# Altium schematic symbol library Sang_library.SchLib: 1607 symbols (part 13 of 15) (continued)
## STM32F303VET6 (continued)
part B pins: 6 VBAT (power) "Backup power supply", 20 VSSA/VREF- (power) "Analog ground/Negative reference voltage", 21 VREF+ (power) "Positive reference voltage", 22 VDDA (power) "Analog power supply", 28 VDD_4 (power) "Digital power supply", 49 VSS_2 (power) "Digital ground", 50 VDD_2 (power) "Digital power supply", 74 VSS_3 (power) "Ground", 75 VDD_3 (power) "Digital power supply", 99 VSS_1 (power) "Ground", 100 VDD_1 (power) "Digital power supply"

## STM32F405RGT7
designator U?
ARM® Cortex®-M4 STM32F4 Microcontroller IC 32-Bit Single-Core 168MHz 1MB (1M x 8) FLASH 64-LQFP (10x10)
footprint LQFP64 (STM) (LQFP64-P-1010-0.50E / 64Pins)
part A pins: 1 VBAT, 12 VSSA, 13 VDDA, 18 VSS, 19 VDD, 32 VDD, 48 VDD, 63 VSS, 64 VDD
part B pins: 2 PC13, 3 PC14-OSC32 IN, 4 PC15-OSC32 OUT, 5 PH0-OSC_IN, 6 PH1-OSC_OUT, 7 ~{RST}, 8 PC0, 9 PC1, 10 PC2, 11 PC3, 14 PA0, 15 PA1, 16 PA2, 17 PA3, 20 PA4, 21 PA5, 22 PA6, 23 PA7, 24 PC4, 25 PC5, 26 PB0, 27 PB1, 28 PB2, 29 PB10, 30 PB11, 31 VCAP_1, 33 PB12, 34 PB13, 35 PB14, 36 PB15, 37 PC6, 38 PC7, 39 PC8, 40 PC9, 41 PA8, 42 PA9, 43 PA10, 44 PA11, 45 PA12, 46 PA13 (JTMS-SWDIO), 47 VCAP_2, 49 PA14 (JTCK-SWCLK), 50 PA15 (JTDI), 51 PC10, 52 PC11, 53 PC12, 54 PD2, 55 PB3 (JTDO/TRACESWO), 56 PB4, 57 PB5, 58 PB6, 59 PB7, 60 BOOT0, 61 PB8, 62 PB9

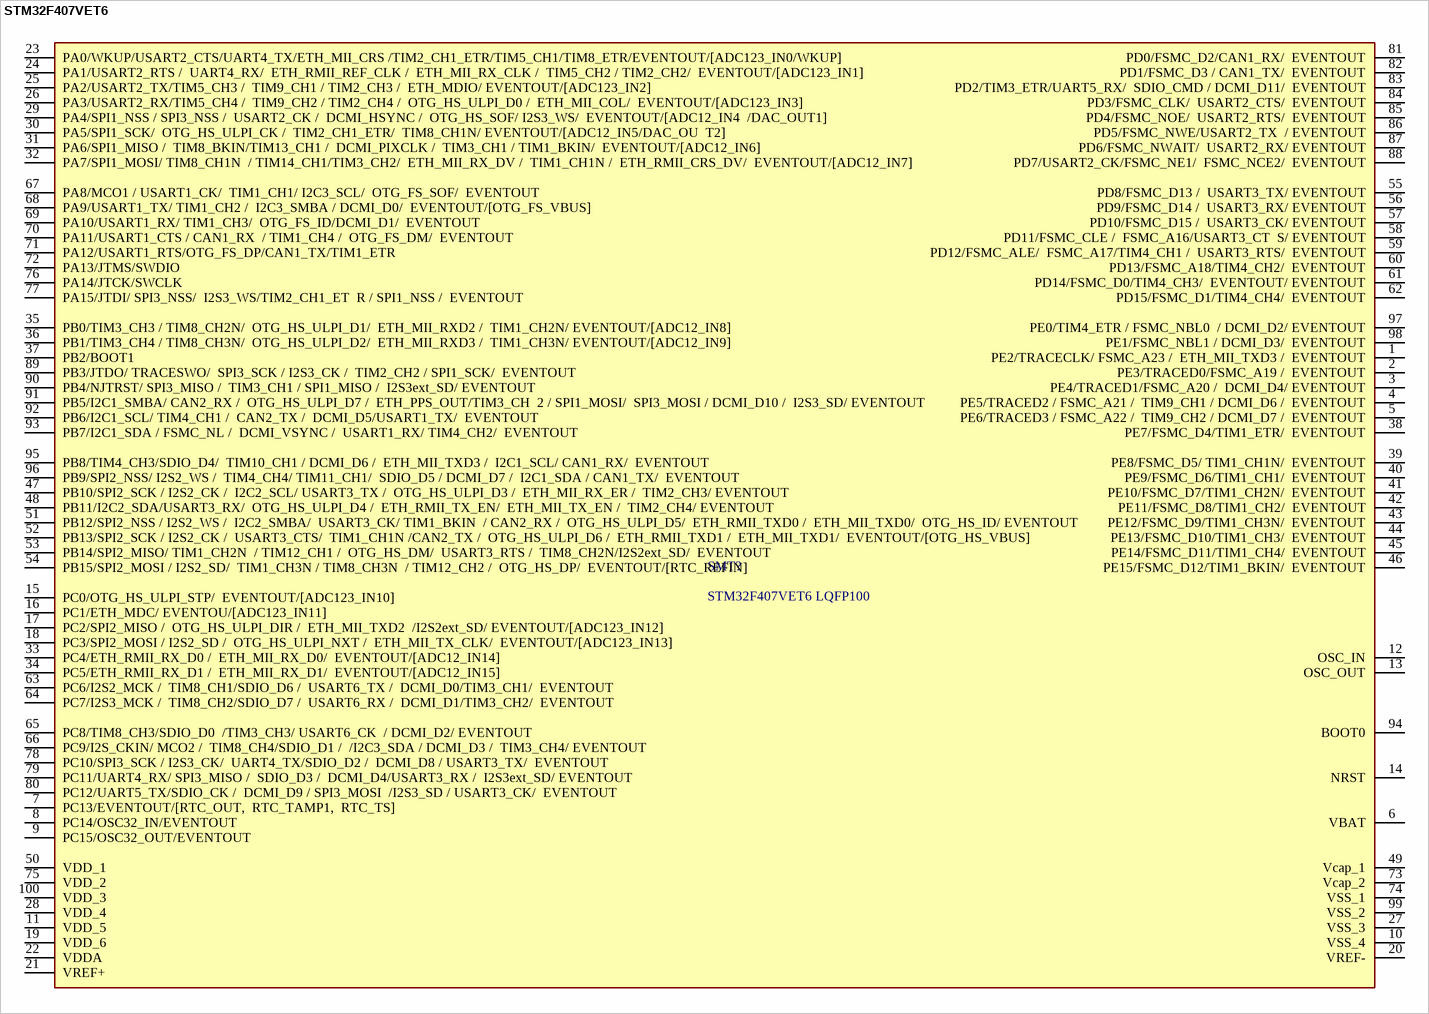
[diagram p85: symbol STM32F407VET6]

## STM32F407VET6
designator SMT?, comment STM32F407VET6 LQFP100
Dán; Don_Vi: Con; Ma_Hang: MH003296; Ten_Linh_Kien: STM32F407VET6 LQFP100; Ghi_Chu: *; Kieu_Chan: *; Chung_Loai: Dán
footprint LQFP 100
pins: 1 PE2/TRACECLK/ FSMC_A23 /  ETH_MII_TXD3 /  EVENTOUT, 2 PE3/TRACED0/FSMC_A19 /  EVENTOUT, 3 PE4/TRACED1/FSMC_A20 /  DCMI_D4/ EVENTOUT, 4 PE5/TRACED2 / FSMC_A21 /  TIM9_CH1 / DCMI_D6 /  EVENTOUT, 5 PE6/TRACED3 / FSMC_A22 /  TIM9_CH2 / DCMI_D7 /  EVENTOUT, 6 VBAT, 7 PC13/EVENTOUT/[RTC_OUT,  RTC_TAMP1,  RTC_TS], 8 PC14/OSC32_IN/EVENTOUT, 9 PC15/OSC32_OUT/EVENTOUT, 10 VSS_4, 11 VDD_5, 12 OSC_IN, 13 OSC_OUT, 14 NRST, 15 PC0/OTG_HS_ULPI_STP/  EVENTOUT/[ADC123_IN10], 16 PC1/ETH_MDC/ EVENTOU/[ADC123_IN11], 17 PC2/SPI2_MISO /  OTG_HS_ULPI_DIR /  ETH_MII_TXD2  /I2S2ext_SD/ EVENTOUT/[ADC123_IN12], 18 PC3/SPI2_MOSI / I2S2_SD /  OTG_HS_ULPI_NXT /  ETH_MII_TX_CLK/  EVENTOUT/[ADC123_IN13], 19 VDD_6, 20 VREF-, 21 VREF+, 22 VDDA, 23 PA0/WKUP/USART2_CTS/UART4_TX/ETH_MII_CRS /TIM2_CH1_ETR/TIM5_CH1/TIM8_ETR/EVENTOUT/[ADC123_IN0/WKUP], 24 PA1/USART2_RTS /  UART4_RX/  ETH_RMII_REF_CLK /  ETH_MII_RX_CLK /  TIM5_CH2 / TIM2_CH2/  EVENTOUT/[ADC123_IN1], 25 PA2/USART2_TX/TIM5_CH3 /  TIM9_CH1 / TIM2_CH3 /  ETH_MDIO/ EVENTOUT/[ADC123_IN2], 26 PA3/USART2_RX/TIM5_CH4 /  TIM9_CH2 / TIM2_CH4 /  OTG_HS_ULPI_D0 /  ETH_MII_COL/  EVENTOUT/[ADC123_IN3], 27 VSS_3, 28 VDD_4, 29 PA4/SPI1_NSS / SPI3_NSS /  USART2_CK /  DCMI_HSYNC /  OTG_HS_SOF/ I2S3_WS/  EVENTOUT/[ADC12_IN4  /DAC_OUT1], 30 PA5/SPI1_SCK/  OTG_HS_ULPI_CK /  TIM2_CH1_ETR/  TIM8_CH1N/ EVENTOUT/[ADC12_IN5/DAC_OU  T2], 31 PA6/SPI1_MISO /  TIM8_BKIN/TIM13_CH1 /  DCMI_PIXCLK /  TIM3_CH1 / TIM1_BKIN/  EVENTOUT/[ADC12_IN6], 32 PA7/SPI1_MOSI/ TIM8_CH1N  / TIM14_CH1/TIM3_CH2/  ETH_MII_RX_DV /  TIM1_CH1N /  ETH_RMII_CRS_DV/  EVENTOUT/[ADC12_IN7], 33 PC4/ETH_RMII_RX_D0 /  ETH_MII_RX_D0/  EVENTOUT/[ADC12_IN14], 34 PC5/ETH_RMII_RX_D1 /  ETH_MII_RX_D1/  EVENTOUT/[ADC12_IN15], 35 PB0/TIM3_CH3 / TIM8_CH2N/  OTG_HS_ULPI_D1/  ETH_MII_RXD2 /  TIM1_CH2N/ EVENTOUT/[ADC12_IN8], 36 PB1/TIM3_CH4 / TIM8_CH3N/  OTG_HS_ULPI_D2/  ETH_MII_RXD3 /  TIM1_CH3N/ EVENTOUT/[ADC12_IN9], 37 PB2/BOOT1  , 38 PE7/FSMC_D4/TIM1_ETR/  EVENTOUT, 39 PE8/FSMC_D5/ TIM1_CH1N/  EVENTOUT, 40 PE9/FSMC_D6/TIM1_CH1/  EVENTOUT, 41 PE10/FSMC_D7/TIM1_CH2N/  EVENTOUT, 42 PE11/FSMC_D8/TIM1_CH2/  EVENTOUT, 43 PE12/FSMC_D9/TIM1_CH3N/  EVENTOUT, 44 PE13/FSMC_D10/TIM1_CH3/  EVENTOUT, 45 PE14/FSMC_D11/TIM1_CH4/  EVENTOUT, 46 PE15/FSMC_D12/TIM1_BKIN/  EVENTOUT, 47 PB10/SPI2_SCK / I2S2_CK /  I2C2_SCL/ USART3_TX /  OTG_HS_ULPI_D3 /  ETH_MII_RX_ER /  TIM2_CH3/ EVENTOUT, 48 PB11/I2C2_SDA/USART3_RX/  OTG_HS_ULPI_D4 /  ETH_RMII_TX_EN/  ETH_MII_TX_EN /  TIM2_CH4/ EVENTOUT, 49 Vcap_1, 50 VDD_1, 51 PB12/SPI2_NSS / I2S2_WS /  I2C2_SMBA/  USART3_CK/ TIM1_BKIN  / CAN2_RX /  OTG_HS_ULPI_D5/  ETH_RMII_TXD0 /  ETH_MII_TXD0/  OTG_HS_ID/ EVENTOUT, 52 PB13/SPI2_SCK / I2S2_CK /  USART3_CTS/  TIM1_CH1N /CAN2_TX /  OTG_HS_ULPI_D6 /  ETH_RMII_TXD1 /  ETH_MII_TXD1/  EVENTOUT/[OTG_HS_VBUS], 53 PB14/SPI2_MISO/ TIM1_CH2N  / TIM12_CH1 /  OTG_HS_DM/  USART3_RTS /  TIM8_CH2N/I2S2ext_SD/  EVENTOUT, 54 PB15/SPI2_MOSI / I2S2_SD/  TIM1_CH3N / TIM8_CH3N  / TIM12_CH2 /  OTG_HS_DP/  EVENTOUT/[RTC_REFIN], 55 PD8/FSMC_D13 /  USART3_TX/ EVENTOUT, 56 PD9/FSMC_D14 /  USART3_RX/ EVENTOUT, 57 PD10/FSMC_D15 /  USART3_CK/ EVENTOUT, 58 PD11/FSMC_CLE /  FSMC_A16/USART3_CT  S/ EVENTOUT, 59 PD12/FSMC_ALE/  FSMC_A17/TIM4_CH1 /  USART3_RTS/  EVENTOUT, 60 PD13/FSMC_A18/TIM4_CH2/  EVENTOUT, 61 PD14/FSMC_D0/TIM4_CH3/  EVENTOUT/ EVENTOUT, 62 PD15/FSMC_D1/TIM4_CH4/  EVENTOUT, 63 PC6/I2S2_MCK /  TIM8_CH1/SDIO_D6 /  USART6_TX /  DCMI_D0/TIM3_CH1/  EVENTOUT, 64 PC7/I2S3_MCK /  TIM8_CH2/SDIO_D7 /  USART6_RX /  DCMI_D1/TIM3_CH2/  EVENTOUT, 65 PC8/TIM8_CH3/SDIO_D0  /TIM3_CH3/ USART6_CK  / DCMI_D2/ EVENTOUT, 66 PC9/I2S_CKIN/ MCO2 /  TIM8_CH4/SDIO_D1 /  /I2C3_SDA / DCMI_D3 /  TIM3_CH4/ EVENTOUT, 67 PA8/MCO1 / USART1_CK/  TIM1_CH1/ I2C3_SCL/  OTG_FS_SOF/  EVENTOUT, 68 PA9/USART1_TX/ TIM1_CH2 /  I2C3_SMBA / DCMI_D0/  EVENTOUT/[OTG_FS_VBUS], 69 PA10/USART1_RX/ TIM1_CH3/  OTG_FS_ID/DCMI_D1/  EVENTOUT, 70 PA11/USART1_CTS / CAN1_RX  / TIM1_CH4 /  OTG_FS_DM/  EVENTOUT, 71 PA12/USART1_RTS/OTG_FS_DP/CAN1_TX/TIM1_ETR  , 72 PA13/JTMS/SWDIO  , 73 Vcap_2, 74 VSS_1, 75 VDD_2, 76 PA14/JTCK/SWCLK  , 77 PA15/JTDI/ SPI3_NSS/  I2S3_WS/TIM2_CH1_ET  R / SPI1_NSS /  EVENTOUT, 78 PC10/SPI3_SCK / I2S3_CK/  UART4_TX/SDIO_D2 /  DCMI_D8 / USART3_TX/  EVENTOUT, 79 PC11/UART4_RX/ SPI3_MISO /  SDIO_D3 /  DCMI_D4/USART3_RX /  I2S3ext_SD/ EVENTOUT, 80 PC12/UART5_TX/SDIO_CK /  DCMI_D9 / SPI3_MOSI  /I2S3_SD / USART3_CK/  EVENTOUT, 81 PD0/FSMC_D2/CAN1_RX/  EVENTOUT, 82 PD1/FSMC_D3 / CAN1_TX/  EVENTOUT, 83 PD2/TIM3_ETR/UART5_RX/  SDIO_CMD / DCMI_D11/  EVENTOUT, 84 PD3/FSMC_CLK/  USART2_CTS/  EVENTOUT, 85 PD4/FSMC_NOE/  USART2_RTS/  EVENTOUT, 86 PD5/FSMC_NWE/USART2_TX  / EVENTOUT, 87 PD6/FSMC_NWAIT/  USART2_RX/ EVENTOUT, 88 PD7/USART2_CK/FSMC_NE1/  FSMC_NCE2/  EVENTOUT, 89 PB3/JTDO/ TRACESWO/  SPI3_SCK / I2S3_CK /  TIM2_CH2 / SPI1_SCK/  EVENTOUT, 90 PB4/NJTRST/ SPI3_MISO /  TIM3_CH1 / SPI1_MISO /  I2S3ext_SD/ EVENTOUT, 91 PB5/I2C1_SMBA/ CAN2_RX /  OTG_HS_ULPI_D7 /  ETH_PPS_OUT/TIM3_CH  2 / SPI1_MOSI/  SPI3_MOSI / DCMI_D10 /  I2S3_SD/ EVENTOUT, 92 PB6/I2C1_SCL/ TIM4_CH1 /  CAN2_TX /  DCMI_D5/USART1_TX/  EVENTOUT, 93 PB7/I2C1_SDA / FSMC_NL /  DCMI_VSYNC /  USART1_RX/ TIM4_CH2/  EVENTOUT, 94 BOOT0, 95 PB8/TIM4_CH3/SDIO_D4/  TIM10_CH1 / DCMI_D6 /  ETH_MII_TXD3 /  I2C1_SCL/ CAN1_RX/  EVENTOUT, 96 PB9/SPI2_NSS/ I2S2_WS /  TIM4_CH4/ TIM11_CH1/  SDIO_D5 / DCMI_D7 /  I2C1_SDA / CAN1_TX/  EVENTOUT, 97 PE0/TIM4_ETR / FSMC_NBL0  / DCMI_D2/ EVENTOUT, 98 PE1/FSMC_NBL1 / DCMI_D3/  EVENTOUT, 99 VSS_2, 100 VDD_3

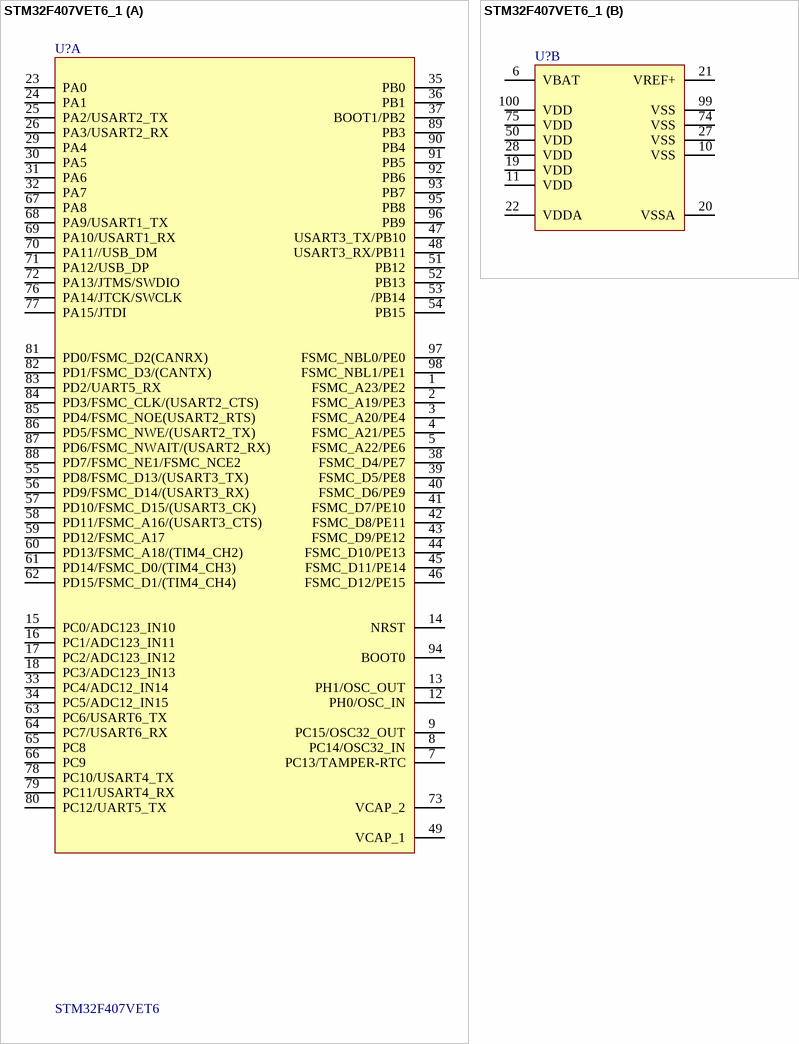
[diagram p86: symbol STM32F407VET6_1]

## STM32F407VET6_1
designator U?, comment STM32F407VET6
ARM Cortex-M4, 168 MHz, 192 kB RAM, 512 kB ROM; MFR: ST; MPN: STM32F407VET6
footprint LQFP-100 (Low Profile Quad Flat Pack (LQFP), 0.50 mm pitch; square, 25 pin X 25 pin, 14.00 mm L X 14.00 mm W X 1.60 mm H body)
part A pins: 1 FSMC_A23/PE2, 2 FSMC_A19/PE3, 3 FSMC_A20/PE4, 4 FSMC_A21/PE5, 5 FSMC_A22/PE6, 7 PC13/TAMPER-RTC, 8 PC14/OSC32_IN, 9 PC15/OSC32_OUT, 12 PH0/OSC_IN, 13 PH1/OSC_OUT, 14 NRST, 15 PC0/ADC123_IN10, 16 PC1/ADC123_IN11, 17 PC2/ADC123_IN12, 18 PC3/ADC123_IN13, 23 PA0, 24 PA1, 25 PA2/USART2_TX, 26 PA3/USART2_RX, 29 PA4, 30 PA5, 31 PA6, 32 PA7, 33 PC4/ADC12_IN14, 34 PC5/ADC12_IN15, 35 PB0, 36 PB1, 37 BOOT1/PB2, 38 FSMC_D4/PE7, 39 FSMC_D5/PE8, 40 FSMC_D6/PE9, 41 FSMC_D7/PE10, 42 FSMC_D8/PE11, 43 FSMC_D9/PE12, 44 FSMC_D10/PE13, 45 FSMC_D11/PE14, 46 FSMC_D12/PE15, 47 USART3_TX/PB10, 48 USART3_RX/PB11, 49 VCAP_1, 51 PB12, 52 PB13, 53 /PB14, 54 PB15, 55 PD8/FSMC_D13/(USART3_TX), 56 PD9/FSMC_D14/(USART3_RX), 57 PD10/FSMC_D15/(USART3_CK), 58 PD11/FSMC_A16/(USART3_CTS), 59 PD12/FSMC_A17, 60 PD13/FSMC_A18/(TIM4_CH2), 61 PD14/FSMC_D0/(TIM4_CH3), 62 PD15/FSMC_D1/(TIM4_CH4), 63 PC6/USART6_TX, 64 PC7/USART6_RX, 65 PC8, 66 PC9, 67 PA8, 68 PA9/USART1_TX, 69 PA10/USART1_RX, 70 PA11//USB_DM, 71 PA12/USB_DP, 72 PA13/JTMS/SWDIO, 73 VCAP_2, 76 PA14/JTCK/SWCLK, 77 PA15/JTDI, 78 PC10/USART4_TX, 79 PC11/USART4_RX, 80 PC12/UART5_TX, 81 PD0/FSMC_D2(CANRX), 82 PD1/FSMC_D3/(CANTX), 83 PD2/UART5_RX, 84 PD3/FSMC_CLK/(USART2_CTS), 85 PD4/FSMC_NOE(USART2_RTS), 86 PD5/FSMC_NWE/(USART2_TX), 87 PD6/FSMC_NWAIT/(USART2_RX), 88 PD7/FSMC_NE1/FSMC_NCE2, 89 PB3, 90 PB4, 91 PB5, 92 PB6, 93 PB7, 94 BOOT0, 95 PB8, 96 PB9, 97 FSMC_NBL0/PE0, 98 FSMC_NBL1/PE1
part B pins: 6 VBAT, 10 VSS, 11 VDD, 19 VDD, 20 VSSA, 21 VREF+, 22 VDDA, 27 VSS, 28 VDD, 50 VDD, 74 VSS, 75 VDD, 99 VSS, 100 VDD

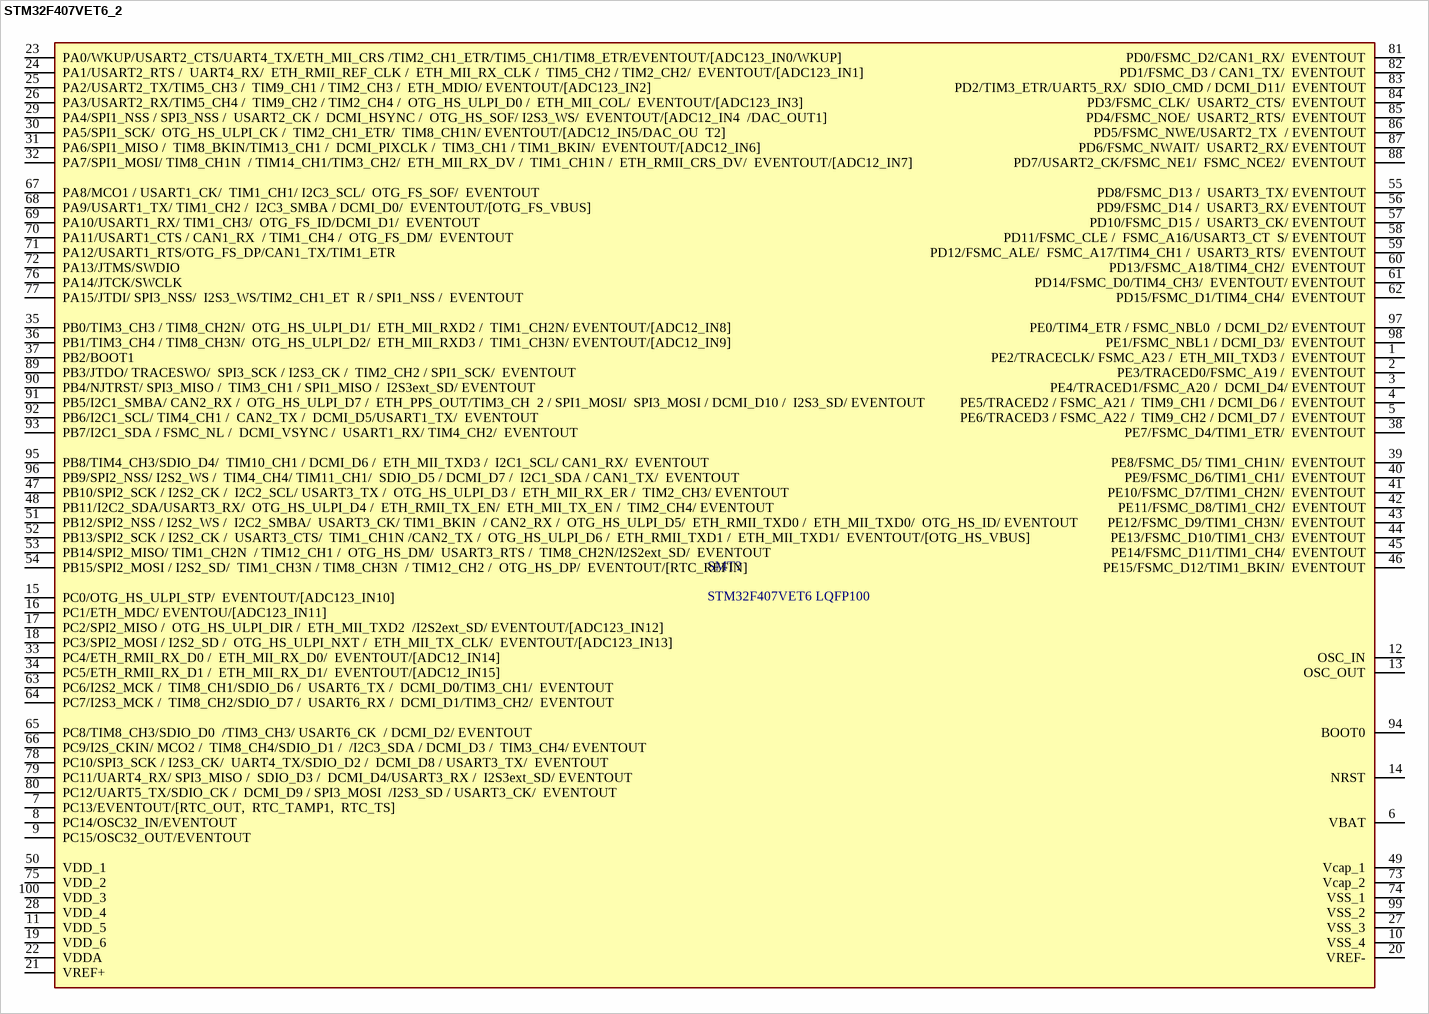
[diagram p87: symbol STM32F407VET6_2]

## STM32F407VET6_2
designator SMT?, comment STM32F407VET6 LQFP100
Dán; Don_Vi: Con; Ma_Hang: MH003296; Ten_Linh_Kien: STM32F407VET6 LQFP100; Ghi_Chu: *; Kieu_Chan: *; Chung_Loai: Dán
footprint LQFP 100
pins: 1 PE2/TRACECLK/ FSMC_A23 /  ETH_MII_TXD3 /  EVENTOUT, 2 PE3/TRACED0/FSMC_A19 /  EVENTOUT, 3 PE4/TRACED1/FSMC_A20 /  DCMI_D4/ EVENTOUT, 4 PE5/TRACED2 / FSMC_A21 /  TIM9_CH1 / DCMI_D6 /  EVENTOUT, 5 PE6/TRACED3 / FSMC_A22 /  TIM9_CH2 / DCMI_D7 /  EVENTOUT, 6 VBAT, 7 PC13/EVENTOUT/[RTC_OUT,  RTC_TAMP1,  RTC_TS], 8 PC14/OSC32_IN/EVENTOUT, 9 PC15/OSC32_OUT/EVENTOUT, 10 VSS_4, 11 VDD_5, 12 OSC_IN, 13 OSC_OUT, 14 NRST, 15 PC0/OTG_HS_ULPI_STP/  EVENTOUT/[ADC123_IN10], 16 PC1/ETH_MDC/ EVENTOU/[ADC123_IN11], 17 PC2/SPI2_MISO /  OTG_HS_ULPI_DIR /  ETH_MII_TXD2  /I2S2ext_SD/ EVENTOUT/[ADC123_IN12], 18 PC3/SPI2_MOSI / I2S2_SD /  OTG_HS_ULPI_NXT /  ETH_MII_TX_CLK/  EVENTOUT/[ADC123_IN13], 19 VDD_6, 20 VREF-, 21 VREF+, 22 VDDA, 23 PA0/WKUP/USART2_CTS/UART4_TX/ETH_MII_CRS /TIM2_CH1_ETR/TIM5_CH1/TIM8_ETR/EVENTOUT/[ADC123_IN0/WKUP], 24 PA1/USART2_RTS /  UART4_RX/  ETH_RMII_REF_CLK /  ETH_MII_RX_CLK /  TIM5_CH2 / TIM2_CH2/  EVENTOUT/[ADC123_IN1], 25 PA2/USART2_TX/TIM5_CH3 /  TIM9_CH1 / TIM2_CH3 /  ETH_MDIO/ EVENTOUT/[ADC123_IN2], 26 PA3/USART2_RX/TIM5_CH4 /  TIM9_CH2 / TIM2_CH4 /  OTG_HS_ULPI_D0 /  ETH_MII_COL/  EVENTOUT/[ADC123_IN3], 27 VSS_3, 28 VDD_4, 29 PA4/SPI1_NSS / SPI3_NSS /  USART2_CK /  DCMI_HSYNC /  OTG_HS_SOF/ I2S3_WS/  EVENTOUT/[ADC12_IN4  /DAC_OUT1], 30 PA5/SPI1_SCK/  OTG_HS_ULPI_CK /  TIM2_CH1_ETR/  TIM8_CH1N/ EVENTOUT/[ADC12_IN5/DAC_OU  T2], 31 PA6/SPI1_MISO /  TIM8_BKIN/TIM13_CH1 /  DCMI_PIXCLK /  TIM3_CH1 / TIM1_BKIN/  EVENTOUT/[ADC12_IN6], 32 PA7/SPI1_MOSI/ TIM8_CH1N  / TIM14_CH1/TIM3_CH2/  ETH_MII_RX_DV /  TIM1_CH1N /  ETH_RMII_CRS_DV/  EVENTOUT/[ADC12_IN7], 33 PC4/ETH_RMII_RX_D0 /  ETH_MII_RX_D0/  EVENTOUT/[ADC12_IN14], 34 PC5/ETH_RMII_RX_D1 /  ETH_MII_RX_D1/  EVENTOUT/[ADC12_IN15], 35 PB0/TIM3_CH3 / TIM8_CH2N/  OTG_HS_ULPI_D1/  ETH_MII_RXD2 /  TIM1_CH2N/ EVENTOUT/[ADC12_IN8], 36 PB1/TIM3_CH4 / TIM8_CH3N/  OTG_HS_ULPI_D2/  ETH_MII_RXD3 /  TIM1_CH3N/ EVENTOUT/[ADC12_IN9], 37 PB2/BOOT1  , 38 PE7/FSMC_D4/TIM1_ETR/  EVENTOUT, 39 PE8/FSMC_D5/ TIM1_CH1N/  EVENTOUT, 40 PE9/FSMC_D6/TIM1_CH1/  EVENTOUT, 41 PE10/FSMC_D7/TIM1_CH2N/  EVENTOUT, 42 PE11/FSMC_D8/TIM1_CH2/  EVENTOUT, 43 PE12/FSMC_D9/TIM1_CH3N/  EVENTOUT, 44 PE13/FSMC_D10/TIM1_CH3/  EVENTOUT, 45 PE14/FSMC_D11/TIM1_CH4/  EVENTOUT, 46 PE15/FSMC_D12/TIM1_BKIN/  EVENTOUT, 47 PB10/SPI2_SCK / I2S2_CK /  I2C2_SCL/ USART3_TX /  OTG_HS_ULPI_D3 /  ETH_MII_RX_ER /  TIM2_CH3/ EVENTOUT, 48 PB11/I2C2_SDA/USART3_RX/  OTG_HS_ULPI_D4 /  ETH_RMII_TX_EN/  ETH_MII_TX_EN /  TIM2_CH4/ EVENTOUT, 49 Vcap_1, 50 VDD_1, 51 PB12/SPI2_NSS / I2S2_WS /  I2C2_SMBA/  USART3_CK/ TIM1_BKIN  / CAN2_RX /  OTG_HS_ULPI_D5/  ETH_RMII_TXD0 /  ETH_MII_TXD0/  OTG_HS_ID/ EVENTOUT, 52 PB13/SPI2_SCK / I2S2_CK /  USART3_CTS/  TIM1_CH1N /CAN2_TX /  OTG_HS_ULPI_D6 /  ETH_RMII_TXD1 /  ETH_MII_TXD1/  EVENTOUT/[OTG_HS_VBUS], 53 PB14/SPI2_MISO/ TIM1_CH2N  / TIM12_CH1 /  OTG_HS_DM/  USART3_RTS /  TIM8_CH2N/I2S2ext_SD/  EVENTOUT, 54 PB15/SPI2_MOSI / I2S2_SD/  TIM1_CH3N / TIM8_CH3N  / TIM12_CH2 /  OTG_HS_DP/  EVENTOUT/[RTC_REFIN], 55 PD8/FSMC_D13 /  USART3_TX/ EVENTOUT, 56 PD9/FSMC_D14 /  USART3_RX/ EVENTOUT, 57 PD10/FSMC_D15 /  USART3_CK/ EVENTOUT, 58 PD11/FSMC_CLE /  FSMC_A16/USART3_CT  S/ EVENTOUT, 59 PD12/FSMC_ALE/  FSMC_A17/TIM4_CH1 /  USART3_RTS/  EVENTOUT, 60 PD13/FSMC_A18/TIM4_CH2/  EVENTOUT, 61 PD14/FSMC_D0/TIM4_CH3/  EVENTOUT/ EVENTOUT, 62 PD15/FSMC_D1/TIM4_CH4/  EVENTOUT, 63 PC6/I2S2_MCK /  TIM8_CH1/SDIO_D6 /  USART6_TX /  DCMI_D0/TIM3_CH1/  EVENTOUT, 64 PC7/I2S3_MCK /  TIM8_CH2/SDIO_D7 /  USART6_RX /  DCMI_D1/TIM3_CH2/  EVENTOUT, 65 PC8/TIM8_CH3/SDIO_D0  /TIM3_CH3/ USART6_CK  / DCMI_D2/ EVENTOUT, 66 PC9/I2S_CKIN/ MCO2 /  TIM8_CH4/SDIO_D1 /  /I2C3_SDA / DCMI_D3 /  TIM3_CH4/ EVENTOUT, 67 PA8/MCO1 / USART1_CK/  TIM1_CH1/ I2C3_SCL/  OTG_FS_SOF/  EVENTOUT, 68 PA9/USART1_TX/ TIM1_CH2 /  I2C3_SMBA / DCMI_D0/  EVENTOUT/[OTG_FS_VBUS], 69 PA10/USART1_RX/ TIM1_CH3/  OTG_FS_ID/DCMI_D1/  EVENTOUT, 70 PA11/USART1_CTS / CAN1_RX  / TIM1_CH4 /  OTG_FS_DM/  EVENTOUT, 71 PA12/USART1_RTS/OTG_FS_DP/CAN1_TX/TIM1_ETR  , 72 PA13/JTMS/SWDIO  , 73 Vcap_2, 74 VSS_1, 75 VDD_2, 76 PA14/JTCK/SWCLK  , 77 PA15/JTDI/ SPI3_NSS/  I2S3_WS/TIM2_CH1_ET  R / SPI1_NSS /  EVENTOUT, 78 PC10/SPI3_SCK / I2S3_CK/  UART4_TX/SDIO_D2 /  DCMI_D8 / USART3_TX/  EVENTOUT, 79 PC11/UART4_RX/ SPI3_MISO /  SDIO_D3 /  DCMI_D4/USART3_RX /  I2S3ext_SD/ EVENTOUT, 80 PC12/UART5_TX/SDIO_CK /  DCMI_D9 / SPI3_MOSI  /I2S3_SD / USART3_CK/  EVENTOUT, 81 PD0/FSMC_D2/CAN1_RX/  EVENTOUT, 82 PD1/FSMC_D3 / CAN1_TX/  EVENTOUT, 83 PD2/TIM3_ETR/UART5_RX/  SDIO_CMD / DCMI_D11/  EVENTOUT, 84 PD3/FSMC_CLK/  USART2_CTS/  EVENTOUT, 85 PD4/FSMC_NOE/  USART2_RTS/  EVENTOUT, 86 PD5/FSMC_NWE/USART2_TX  / EVENTOUT, 87 PD6/FSMC_NWAIT/  USART2_RX/ EVENTOUT, 88 PD7/USART2_CK/FSMC_NE1/  FSMC_NCE2/  EVENTOUT, 89 PB3/JTDO/ TRACESWO/  SPI3_SCK / I2S3_CK /  TIM2_CH2 / SPI1_SCK/  EVENTOUT, 90 PB4/NJTRST/ SPI3_MISO /  TIM3_CH1 / SPI1_MISO /  I2S3ext_SD/ EVENTOUT, 91 PB5/I2C1_SMBA/ CAN2_RX /  OTG_HS_ULPI_D7 /  ETH_PPS_OUT/TIM3_CH  2 / SPI1_MOSI/  SPI3_MOSI / DCMI_D10 /  I2S3_SD/ EVENTOUT, 92 PB6/I2C1_SCL/ TIM4_CH1 /  CAN2_TX /  DCMI_D5/USART1_TX/  EVENTOUT, 93 PB7/I2C1_SDA / FSMC_NL /  DCMI_VSYNC /  USART1_RX/ TIM4_CH2/  EVENTOUT, 94 BOOT0, 95 PB8/TIM4_CH3/SDIO_D4/  TIM10_CH1 / DCMI_D6 /  ETH_MII_TXD3 /  I2C1_SCL/ CAN1_RX/  EVENTOUT, 96 PB9/SPI2_NSS/ I2S2_WS /  TIM4_CH4/ TIM11_CH1/  SDIO_D5 / DCMI_D7 /  I2C1_SDA / CAN1_TX/  EVENTOUT, 97 PE0/TIM4_ETR / FSMC_NBL0  / DCMI_D2/ EVENTOUT, 98 PE1/FSMC_NBL1 / DCMI_D3/  EVENTOUT, 99 VSS_2, 100 VDD_3
